# Altium footprint library MyPcbLib.PcbLib: 657 footprints (part 37 of 42)
Each footprint in its own frame and in the unit in brackets; x right, y up, seen from the top. Pads: shape width x height; smd on the part's side, far side on the other; paste and mask are expansions set on the pad; w line width, h text height; cw(c..) or ccw(c..) is an arc to the next point about the centre after c.
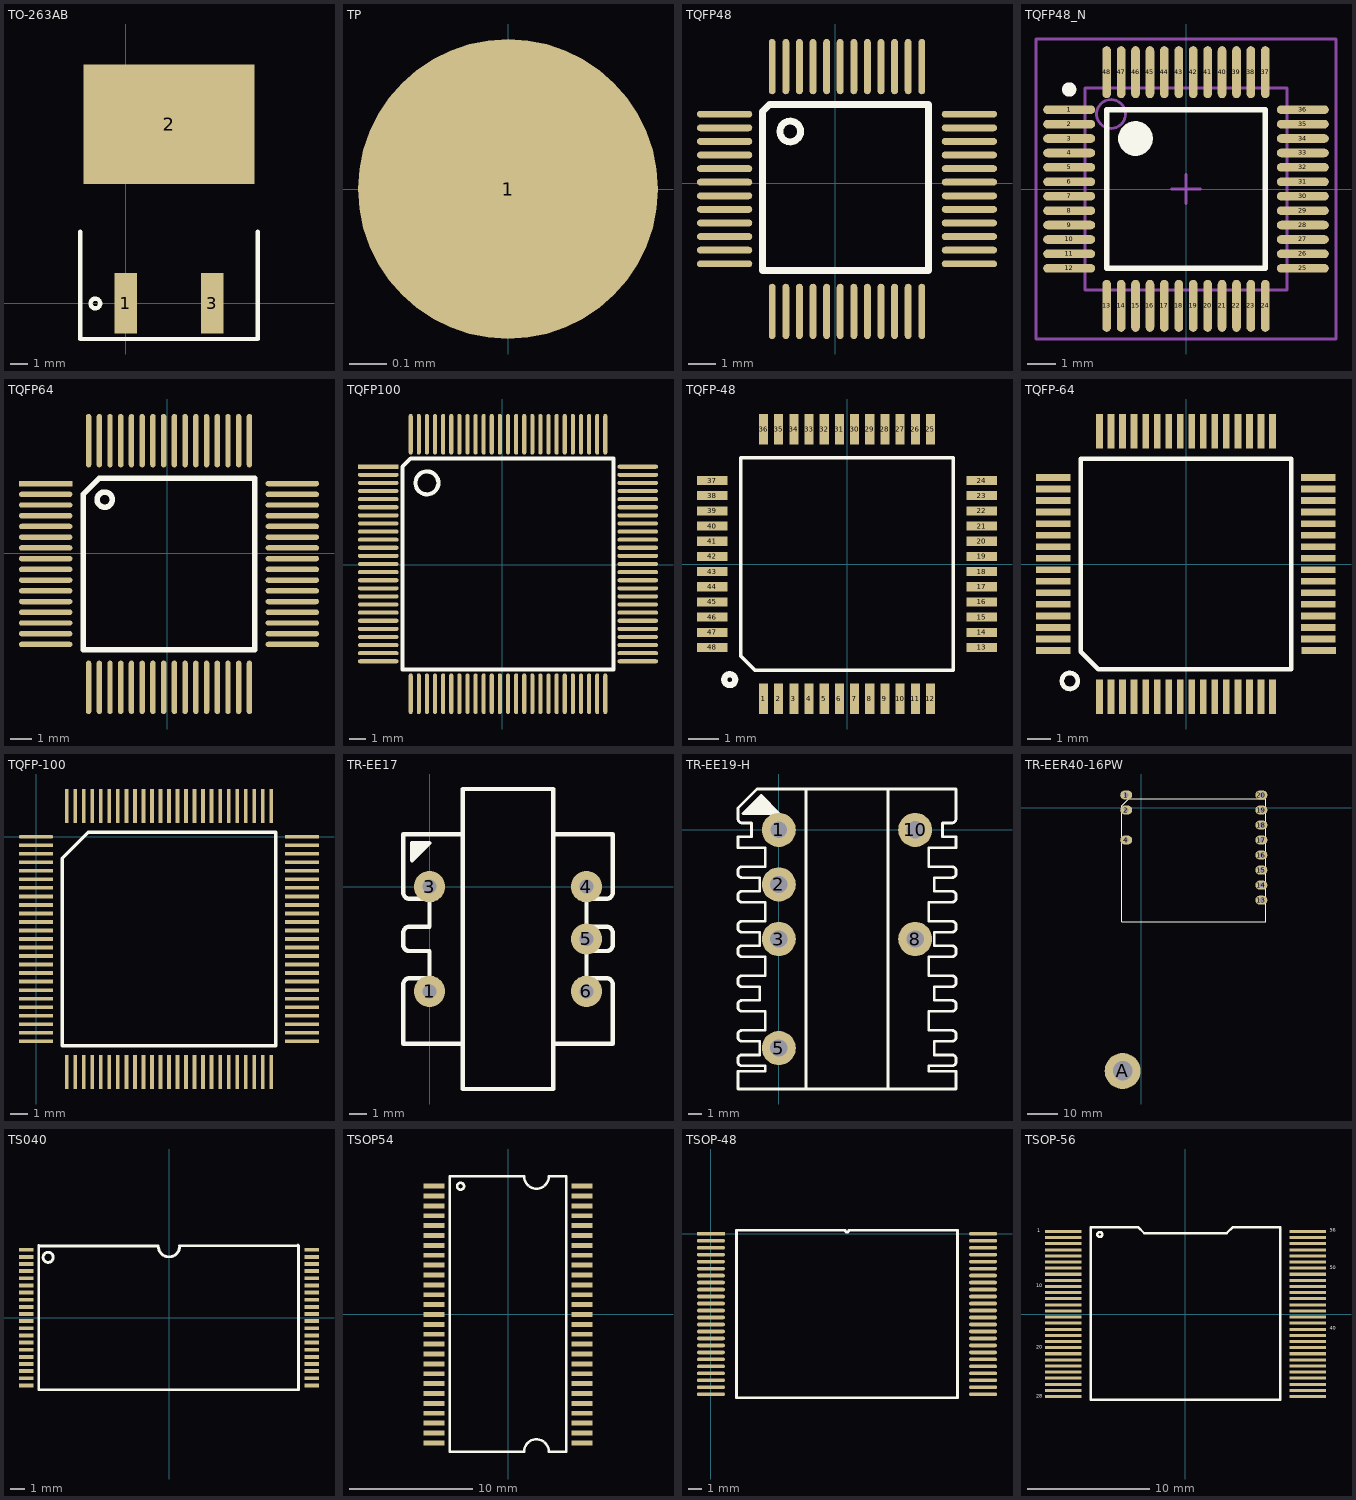
[diagram p36: the footprints below, top view; thin cyan lines are the x and y axes]

## TO-263AB [mm]
height 1.5
pads (3):
  rect 1.3x3.556 smd: 1(0,0) 3(5.08,0)
  rect 10x7 smd: 2(2.54,10.5)
Top Overlay:
  circle w0.254: c-1.778,-0.003 r0.284
  lines w0.254: -2.66,4.2 -2.66,-2.086 7.74,-2.086 7.74,4.2

## TP [mm]
pads (1):
  round 0.8 smd: 1(0,0)

## TQFP48 [mil]
pads (48):
  oval 80x10 smd: 1(-160,100) 2(-160,80.31) 3(-160,60.63) 4(-160,40.95) 5(-160,21.26) 6(-160,1.57) 7(-160,-18.11) 8(-160,-37.8) 9(-160,-57.48) 10(-160,-77.17) 11(-160,-96.85) 12(-160,-116.53) 25(194.33,-116.53) 26(194.33,-96.85) 27(194.33,-77.17) 28(194.33,-57.48) 29(194.33,-37.8) 30(194.33,-18.11) 31(194.33,1.57) 32(194.33,21.26) 33(194.33,40.95) 34(194.33,60.63) 35(194.33,80.31) 36(194.33,100)
  oval 10x80 smd: 13(-91.1,-185.43) 14(-71.42,-185.43) 15(-51.73,-185.43) 16(-32.05,-185.43) 17(-12.36,-185.43) 18(7.32,-185.43) 19(27.01,-185.43) 20(46.69,-185.43) 21(66.38,-185.43) 22(86.06,-185.43) 23(105.75,-185.43) 24(125.43,-185.43) 37(125.43,168.9) 38(105.75,168.9) 39(86.06,168.9) 40(66.38,168.9) 41(46.69,168.9) 42(27.01,168.9) 43(7.32,168.9) 44(-12.36,168.9) 45(-32.05,168.9) 46(-51.73,168.9) 47(-71.42,168.9) 48(-91.1,168.9)
Top Overlay:
  circle w10: c-65,75 r15
  lines w10: -105.02,103.8 -104.88,-126.38 135.28,-126.38 135.28,113.78 -95.04,113.78 -105.02,103.8

## TQFP48_N [mm] "Thin QFP, 48-Leads, Body 7x7mm, Pitch 0.5mm, IPC Medium Density"
height 1.6
pads (48):
  oval 1.8x0.3 smd: 1(-4.05,2.75) 2(-4.05,2.25) 3(-4.05,1.75) 4(-4.05,1.25) 5(-4.05,0.75) 6(-4.05,0.25) 7(-4.05,-0.25) 8(-4.05,-0.75) 9(-4.05,-1.25) 10(-4.05,-1.75) 11(-4.05,-2.25) 12(-4.05,-2.75) 25(4.05,-2.75) 26(4.05,-2.25) 27(4.05,-1.75) 28(4.05,-1.25) 29(4.05,-0.75) 30(4.05,-0.25) 31(4.05,0.25) 32(4.05,0.75) 33(4.05,1.25) 34(4.05,1.75) 35(4.05,2.25) 36(4.05,2.75)
  oval 0.3x1.8 smd: 13(-2.75,-4.05) 14(-2.25,-4.05) 15(-1.75,-4.05) 16(-1.25,-4.05) 17(-0.75,-4.05) 18(-0.25,-4.05) 19(0.25,-4.05) 20(0.75,-4.05) 21(1.25,-4.05) 22(1.75,-4.05) 23(2.25,-4.05) 24(2.75,-4.05) 37(2.75,4.05) 38(2.25,4.05) 39(1.75,4.05) 40(1.25,4.05) 41(0.75,4.05) 42(0.25,4.05) 43(-0.25,4.05) 44(-0.75,4.05) 45(-1.25,4.05) 46(-1.75,4.05) 47(-2.25,4.05) 48(-2.75,4.05)
Top Overlay:
  circle w0.6: c-1.75,1.75 r0.3
  circle w0.25: c-4.05,3.45 r0.125
  lines w0.2: -2.75,-2.75 2.75,-2.75 2.75,2.75 -2.75,2.75 -2.75,-2.75
Mechanical 13:
  circle w0.1: c-2.6,2.6 r0.5
  lines w0.1: -3.5,-3.5 3.5,-3.5 3.5,3.5 -3.5,3.5 -3.5,-3.5
Mechanical 15:
  lines w0.1: -0.5,0 0.5,0 ; 0,-0.5 0,0.5 ; -5.2,-5.2 5.2,-5.2 5.2,5.2 -5.2,5.2 -5.2,-5.2
3D body: height 1.6, standoff 0, extent -3.5,-3.5 3.5,3.5

## TQFP64 [mil]
pads (64):
  rect 98x10 smd: 1(-223.53,128.16)
  oval 98x10 smd: 2(-223.53,108.47) 3(-223.53,88.79) 4(-223.53,69.1) 5(-223.53,49.42) 6(-223.53,29.73) 7(-223.53,10.05) 8(-223.53,-9.64) 9(-223.53,-29.32) 10(-223.53,-49.01) 11(-223.53,-68.69) 12(-223.53,-88.38) 13(-223.53,-108.06) 14(-223.53,-127.75) 15(-223.53,-147.43) 16(-223.53,-167.12) 33(229.23,-167.12) 34(229.23,-147.43) 35(229.23,-127.75) 36(229.23,-108.06) 37(229.23,-88.38) 38(229.23,-68.69) 39(229.23,-49.01) 40(229.23,-29.32) 41(229.23,-9.64) 42(229.23,10.05) 43(229.23,29.73) 44(229.23,49.42) 45(229.23,69.1) 46(229.23,88.79) 47(229.23,108.47) 48(229.23,128.16)
  oval 10x98 smd: 17(-144.79,-245.86) 18(-125.1,-245.86) 19(-105.42,-245.86) 20(-85.73,-245.86) 21(-66.05,-245.86) 22(-46.36,-245.86) 23(-26.68,-245.86) 24(-6.99,-245.86) 25(12.69,-245.86) 26(32.38,-245.86) 27(52.06,-245.86) 28(71.75,-245.86) 29(91.43,-245.86) 30(111.12,-245.86) 31(130.8,-245.86) 32(150.49,-245.86) 49(150.49,206.9) 50(130.8,206.9) 51(111.12,206.9) 52(91.43,206.9) 53(71.75,206.9) 54(52.06,206.9) 55(32.38,206.9) 56(12.69,206.9) 57(-6.99,206.9) 58(-26.68,206.9) 59(-46.36,206.9) 60(-66.05,206.9) 61(-85.73,206.9) 62(-105.42,206.9) 63(-125.1,206.9) 64(-144.79,206.9)
Top Overlay:
  circle w10: c-115.26,98.63 r13.92
  lines w10: -154.63,-176.96 -154.63,108.47 -125.1,138 160.33,138 160.33,-176.96 -154.63,-176.96

## TQFP100 [mm]
pads (100):
  rect 2.5x0.254 smd: 1(-7.655,6.036)
  oval 2.5x0.254 smd: 2(-7.655,5.536) 3(-7.655,5.036) 4(-7.655,4.536) 5(-7.655,4.036) 6(-7.655,3.536) 7(-7.655,3.036) 8(-7.655,2.536) 9(-7.655,2.036) 10(-7.655,1.536) 11(-7.655,1.036) 12(-7.655,0.536) 13(-7.655,0.036) 14(-7.655,-0.464) 15(-7.655,-0.964) 16(-7.655,-1.464) 17(-7.655,-1.964) 18(-7.655,-2.464) 19(-7.655,-2.964) 20(-7.655,-3.464) 21(-7.655,-3.964) 22(-7.655,-4.464) 23(-7.655,-4.964) 24(-7.655,-5.464) 25(-7.655,-5.964) 51(8.345,-5.964) 52(8.345,-5.464) 53(8.345,-4.964) 54(8.345,-4.464) 55(8.345,-3.964) 56(8.345,-3.464) 57(8.345,-2.964) 58(8.345,-2.464) 59(8.345,-1.964) 60(8.345,-1.464) 61(8.345,-0.964) 62(8.345,-0.464) 63(8.345,0.036) 64(8.345,0.536) 65(8.345,1.036) 66(8.345,1.536) 67(8.345,2.036) 68(8.345,2.536) 69(8.345,3.036) 70(8.345,3.536) 71(8.345,4.036) 72(8.345,4.536) 73(8.345,5.036) 74(8.345,5.536) 75(8.345,6.036)
  oval 0.254x2.5 smd: 26(-5.655,-7.964) 27(-5.155,-7.964) 28(-4.655,-7.964) 29(-4.155,-7.964) 30(-3.655,-7.964) 31(-3.155,-7.964) 32(-2.655,-7.964) 33(-2.155,-7.964) 34(-1.655,-7.964) 35(-1.155,-7.964) 36(-0.655,-7.964) 37(-0.155,-7.964) 38(0.345,-7.964) 39(0.845,-7.964) 40(1.345,-7.964) 41(1.845,-7.964) 42(2.345,-7.964) 43(2.845,-7.964) 44(3.345,-7.964) 45(3.845,-7.964) 46(4.345,-7.964) 47(4.845,-7.964) 48(5.345,-7.964) 49(5.845,-7.964) 50(6.345,-7.964) 76(6.345,8.036) 77(5.845,8.036) 78(5.345,8.036) 79(4.845,8.036) 80(4.345,8.036) 81(3.845,8.036) 82(3.345,8.036) 83(2.845,8.036) 84(2.345,8.036) 85(1.845,8.036) 86(1.345,8.036) 87(0.845,8.036) 88(0.345,8.036) 89(-0.155,8.036) 90(-0.655,8.036) 91(-1.155,8.036) 92(-1.655,8.036) 93(-2.155,8.036) 94(-2.655,8.036) 95(-3.155,8.036) 96(-3.655,8.036) 97(-4.155,8.036) 98(-4.655,8.036) 99(-5.155,8.036) 100(-5.655,8.036)
Top Overlay:
  circle w0.254: c-4.655,5.036 r0.707
  lines w0.254: -6.155,-6.464 6.845,-6.464 6.845,6.536 -5.655,6.536 -6.155,6.036 -6.155,-6.464

## TQFP-48 [mm]
pads (48):
  rect 0.3x1 smd: 1(-2.75,-4.441) 2(-2.25,-4.441) 3(-1.75,-4.441) 4(-1.25,-4.441) 5(-0.75,-4.441) 6(-0.25,-4.441) 7(0.25,-4.441) 8(0.75,-4.441) 9(1.25,-4.441) 10(1.75,-4.441) 11(2.25,-4.441) 12(2.75,-4.441) 25(2.75,4.441) 26(2.25,4.441) 27(1.75,4.441) 28(1.25,4.441) 29(0.75,4.441) 30(0.25,4.441) 31(-0.25,4.441) 32(-0.75,4.441) 33(-1.25,4.441) 34(-1.75,4.441) 35(-2.25,4.441) 36(-2.75,4.441)
  rect 1x0.3 smd: 13(4.441,-2.75) 14(4.441,-2.25) 15(4.441,-1.75) 16(4.441,-1.25) 17(4.441,-0.75) 18(4.441,-0.25) 19(4.441,0.25) 20(4.441,0.75) 21(4.441,1.25) 22(4.441,1.75) 23(4.441,2.25) 24(4.441,2.75) 37(-4.441,2.75) 38(-4.441,2.25) 39(-4.441,1.75) 40(-4.441,1.25) 41(-4.441,0.75) 42(-4.441,0.25) 43(-4.441,-0.25) 44(-4.441,-0.75) 45(-4.441,-1.25) 46(-4.441,-1.75) 47(-4.441,-2.25) 48(-4.441,-2.75)
Top Overlay:
  circle w0.203: c-3.863,-3.81 r0.18
  lines w0.127: -3.5,-3.028 -3.5,3.5 3.5,3.5 3.5,-3.5 -3.028,-3.5 -3.5,-3.028

## TQFP-64 [mm]
pads (64):
  rect 0.3x1.5 smd: 1(-3.75,-5.766) 2(-3.25,-5.766) 3(-2.75,-5.766) 4(-2.25,-5.766) 5(-1.75,-5.766) 6(-1.25,-5.766) 7(-0.75,-5.766) 8(-0.25,-5.766) 9(0.25,-5.766) 10(0.75,-5.766) 11(1.25,-5.766) 12(1.75,-5.766) 13(2.25,-5.766) 14(2.75,-5.766) 15(3.25,-5.766) 16(3.75,-5.766) 33(3.75,5.766) 34(3.25,5.766) 35(2.75,5.766) 36(2.25,5.766) 37(1.75,5.766) 38(1.25,5.766) 39(0.75,5.766) 40(0.25,5.766) 41(-0.25,5.766) 42(-0.75,5.766) 43(-1.25,5.766) 44(-1.75,5.766) 45(-2.25,5.766) 46(-2.75,5.766) 47(-3.25,5.766) 48(-3.75,5.766)
  rect 1.5x0.3 smd: 17(5.766,-3.75) 18(5.75,-3.25) 19(5.75,-2.75) 20(5.75,-2.25) 21(5.75,-1.75) 22(5.75,-1.25) 23(5.75,-0.75) 24(5.75,-0.25) 25(5.75,0.25) 26(5.75,0.75) 27(5.75,1.25) 28(5.75,1.75) 29(5.75,2.25) 30(5.75,2.75) 31(5.75,3.25) 32(5.75,3.75) 49(-5.766,3.75) 50(-5.766,3.25) 51(-5.766,2.75) 52(-5.766,2.25) 53(-5.766,1.75) 54(-5.766,1.25) 55(-5.766,0.75) 56(-5.766,0.25) 57(-5.766,-0.25) 58(-5.766,-0.75) 59(-5.766,-1.25) 60(-5.766,-1.75) 61(-5.766,-2.25) 62(-5.766,-2.75) 63(-5.766,-3.25) 64(-5.766,-3.75)
Top Overlay:
  circle w0.203: c-5.046,-5.08 r0.347
  lines w0.203: -4.572,-3.81 -3.81,-4.572 4.572,-4.572 4.572,4.572 -4.572,4.572 -4.572,-3.81

## TQFP-100 [mm]
pads (100):
  oval 2x0.22 smd: 1(0,0)
  rect 2x0.22 smd: 2(0,-0.5) 3(0,-1) 4(0,-1.5) 5(0,-2) 6(0,-2.5) 7(0,-3) 8(0,-3.5) 9(0,-4) 10(0,-4.5) 11(0,-5) 12(0,-5.5) 13(0,-6) 14(0,-6.5) 15(0,-7) 16(0,-7.5) 17(0,-8) 18(0,-8.5) 19(0,-9) 20(0,-9.5) 21(0,-10) 22(0,-10.5) 23(0,-11) 24(0,-11.5) 25(0,-12) 51(15.6,-12) 52(15.6,-11.5) 53(15.6,-11) 54(15.6,-10.5) 55(15.6,-10) 56(15.6,-9.5) 57(15.6,-9) 58(15.6,-8.5) 59(15.6,-8) 60(15.6,-7.5) 61(15.6,-7) 62(15.6,-6.5) 63(15.6,-6) 64(15.6,-5.5) 65(15.6,-5) 66(15.6,-4.5) 67(15.6,-4) 68(15.6,-3.5) 69(15.6,-3) 70(15.6,-2.5) 71(15.6,-2) 72(15.6,-1.5) 73(15.6,-1) 74(15.6,-0.5) 75(15.6,0)
  rect 0.22x2 smd: 26(1.8,-13.8) 27(2.3,-13.8) 28(2.8,-13.8) 29(3.3,-13.8) 30(3.8,-13.8) 31(4.3,-13.8) 32(4.8,-13.8) 33(5.3,-13.8) 34(5.8,-13.8) 35(6.3,-13.8) 36(6.8,-13.8) 37(7.3,-13.8) 38(7.8,-13.8) 39(8.3,-13.8) 40(8.8,-13.8) 41(9.3,-13.8) 42(9.8,-13.8) 43(10.3,-13.8) 44(10.8,-13.8) 45(11.3,-13.8) 46(11.8,-13.8) 47(12.3,-13.8) 48(12.8,-13.8) 49(13.3,-13.8) 50(13.8,-13.8) 76(13.8,1.8) 77(13.3,1.8) 78(12.8,1.8) 79(12.3,1.8) 80(11.8,1.8) 81(11.3,1.8) 82(10.8,1.8) 83(10.3,1.8) 84(9.8,1.8) 85(9.3,1.8) 86(8.8,1.8) 87(8.3,1.8) 88(7.8,1.8) 89(7.3,1.8) 90(6.8,1.8) 91(6.3,1.8) 92(5.8,1.8) 93(5.3,1.8) 94(4.8,1.8) 95(4.3,1.8) 96(3.8,1.8) 97(3.3,1.8) 98(2.8,1.8) 99(2.3,1.8) 100(1.8,1.8)
Top Overlay:
  lines w0.2: 1.535,-12.265 1.535,-1.27 3.07,0.265 14.065,0.265 14.065,-12.265 1.535,-12.265

## TR-EE17 [mm]
pads (5):
  round 1.8 hole 0.8: 1(0,-6) 3(0,0) 4(9,0) 5(9,-3) 6(9,-6)
Top Overlay:
  region: -0.859,1.651 -0.222,2.288 -0.434,2.5 -1.071,1.864
  lines w0.25: -1.5,-0.407 -1.5,3 1.9,3 ; -1.5,-0.35 ccw(c-1.159,-0.35) -1.4,-0.591 ccw(c-1.159,-0.35) -1.159,-0.691 0,-0.7 0,-2.3 -1.159,-2.291 ccw(c-1.159,-2.633) -1.4,-2.391 ccw(c-1.159,-2.633) -1.5,-2.633 -1.5,-3.35 ccw(c-1.159,-3.35) -1.4,-3.591 ccw(c-1.159,-3.35) -1.159,-3.691 0,-3.7 0,-5.26 -1.159,-5.251 ccw(c-1.159,-5.593) -1.4,-5.351 ccw(c-1.159,-5.593) -1.5,-5.593 -1.5,-9 1.9,-9 ; 10.5,-0.407 10.5,3 7.1,3 ; 10.5,-0.35 cw(c10.159,-0.35) 10.4,-0.591 cw(c10.159,-0.35) 10.159,-0.691 9,-0.7 9,-2.3 10.159,-2.291 cw(c10.159,-2.633) 10.4,-2.391 cw(c10.159,-2.633) 10.5,-2.633 10.5,-3.35 cw(c10.159,-3.35) 10.4,-3.591 cw(c10.159,-3.35) 10.159,-3.691 9,-3.683 9,-5.243 10.159,-5.251 cw(c10.159,-5.593) 10.4,-5.351 cw(c10.159,-5.593) 10.5,-5.593 10.5,-9 7.1,-9 ; 1.9,-9 1.9,3 ; 1.9,-9 1.9,-11.6 7.1,-11.6 7.1,-9 ; 1.9,3 1.9,5.6 7.1,5.6 7.1,3 ; 7.1,-9 7.1,3 ; -1,1.51 -0.01,2.5 -1,2.5 -1,1.51
  lines w0.5: -0.788,2.146 -0.576,2.359

## TR-EE19-H [mm]
pads (6):
  round 2.5 hole 1.2: 1(0,0)
  round 2.5 hole 1.27: 2(0,-4) 3(0,-8) 5(0,-16) 8(10,-8) 10(10,0)
Top Overlay:
  rectangle: -1.666,1.5 -0.9,2.134
  rectangle: -0.7,1.2 -0.2,1.5
  rectangle: -1.945,1.2 -0.5,1.855
  lines w0.2: -2.659,0.5 cw(c-2.659,0.841) -2.9,0.6 cw(c-2.659,0.841) -3,0.841 -3,1.6 -1.6,3 13,3 13,0.841 cw(c12.659,0.841) 12.9,0.6 cw(c12.659,0.841) 12.659,0.5 ; -2.6,0.5 -2,0.5 -2,0 -2,-0.5 -3,-0.5 -3,-1.3 -1,-1.3 -1,-2.7 -2.7,-2.7 ccw(c-2.7,-3) -3,-3 -3,-3.2 ccw(c-2.7,-3.2) -2.7,-3.5 -1.4,-3.5 -1.4,-4.5 -2.7,-4.5 ccw(c-2.7,-4.8) -3,-4.8 -3,-5 ccw(c-2.7,-5) -2.7,-5.3 -1,-5.3 -1,-6.7 -2.7,-6.7 ccw(c-2.7,-7) -3,-7 -3,-7.2 ccw(c-2.7,-7.2) -2.7,-7.5 -1.4,-7.5 -1.4,-8.5 -2.7,-8.5 ccw(c-2.7,-8.8) -3,-8.8 -3,-9 ccw(c-2.7,-9) -2.7,-9.3 -1,-9.3 -1,-10.7 -2.7,-10.7 ccw(c-2.7,-11) -3,-11 -3,-11.2 ccw(c-2.7,-11.2) -2.7,-11.5 -1.4,-11.5 -1.4,-12.5 -2.7,-12.5 ccw(c-2.7,-12.8) -3,-12.8 -3,-13 ccw(c-2.7,-13) -2.7,-13.3 -1,-13.3 -1,-14.7 -2.7,-14.7 ccw(c-2.7,-15) -3,-15 -3,-15.2 ccw(c-2.7,-15.2) -2.7,-15.5 -1.4,-15.5 -1.4,-16.5 -2.7,-16.5 ccw(c-2.7,-16.8) -3,-16.8 -3,-17 ccw(c-2.7,-17) -2.7,-17.3 -1,-17.3 -1,-17.7 -3,-17.7 -3,-19 13,-19 13,-17.7 11,-17.7 11,-17.3 12.7,-17.3 ccw(c12.7,-17) 13,-17 13,-16.8 ccw(c12.7,-16.8) 12.7,-16.5 11.4,-16.5 11.4,-15.5 12.7,-15.5 ccw(c12.7,-15.2) 13,-15.2 13,-15 ccw(c12.7,-15) 12.7,-14.7 11,-14.7 11,-13.3 12.7,-13.3 ccw(c12.7,-13) 13,-13 13,-12.8 ccw(c12.7,-12.8) 12.7,-12.5 11.4,-12.5 11.4,-11.5 12.7,-11.5 ccw(c12.7,-11.2) 13,-11.2 13,-11 ccw(c12.7,-11) 12.7,-10.7 11,-10.7 11,-9.3 12.7,-9.3 ccw(c12.7,-9) 13,-9 13,-8.8 ccw(c12.7,-8.8) 12.7,-8.5 11.4,-8.5 11.4,-7.5 12.7,-7.5 ccw(c12.7,-7.2) 13,-7.2 13,-7 ccw(c12.7,-7) 12.7,-6.7 11,-6.7 11,-5.3 12.7,-5.3 ccw(c12.7,-5) 13,-5 13,-4.8 ccw(c12.7,-4.8) 12.7,-4.5 11.4,-4.5 11.4,-3.5 12.7,-3.5 ccw(c12.7,-3.2) 13,-3.2 13,-3 ccw(c12.7,-3) 12.7,-2.7 11,-2.7 11,-1.3 13,-1.3 13,-0.5 12,-0.5 12,0 12,0.5 12.6,0.5 ; 2,-19 2,3 ; 8,-19 8,3
  lines w0.25: -2.2,1.4 -1.6,1.4 ; -2.1,1.4 -1.2,2.3 ; -1.1,2.2 -0.3,1.4 ; -2.6,1.2 0,1.2 -1.3,2.5 -2.6,1.2

## TR-EER40-16PW [mm]
pads (12):
  oval 4x3 hole 1.6: 1(-5,4.2) 2(-5,-0.8) 4(-5,-10.8) 13(40,-30.8) 14(40,-25.8) 15(40,-20.8) 16(40,-15.8) 17(40,-10.8) 18(40,-5.8) 19(40,-0.8) 20(40,4.2)
  round 12 hole 6.5: A(-6.2,-87.7)
Top Overlay:
  lines w0.2: -6.5,0.5 -6.5,-38 41.5,-38 41.5,3 -4,3 -4.1,3 -6.5,0.6

## TS040 [mm]
pads (40):
  rect 1x0.27 smd: 1(-10,4.75) 2(-10,4.25) 3(-10,3.75) 4(-10,3.25) 5(-10,2.75) 6(-10,2.25) 7(-10,1.75) 8(-10,1.25) 9(-10,0.75) 10(-10,0.25) 11(-10,-0.25) 12(-10,-0.75) 13(-10,-1.25) 14(-10,-1.75) 15(-10,-2.25) 16(-10,-2.75) 17(-10,-3.25) 18(-10,-3.75) 19(-10,-4.25) 20(-10,-4.75) 21(10,-4.75) 22(10,-4.25) 23(10,-3.75) 24(10,-3.25) 25(10,-2.75) 26(10,-2.25) 27(10,-1.75) 28(10,-1.25) 29(10,-0.75) 30(10,-0.25) 31(10,0.25) 32(10,0.75) 33(10,1.25) 34(10,1.75) 35(10,2.25) 36(10,2.75) 37(10,3.25) 38(10,3.75) 39(10,4.25) 40(10,4.75)
Top Overlay:
  circle w0.203: c-8.459,4.221 r0.354
  lines w0.203: -9.12,5.05 -9.12,-5.05 9.067,-5.05 9.067,5.05 ; -9.093,5.004 -0.75,5.004 ccw(c0,5.004) 0.75,5.004 ; 0.737,5.029 8.992,5.029 9.042,5.08
3D body: height 1.2, standoff 0, extent -10.04,-5.05 10.16,5.05

## TSOP54 [mm]
pads (54):
  rect 1.72x0.4 smd: 1(-6,10.4) 2(-6,9.6) 3(-6,8.8) 4(-6,8) 5(-6,7.2) 6(-6,6.4) 7(-6,5.6) 8(-6,4.8) 9(-6,4) 10(-6,3.2) 11(-6,2.4) 12(-6,1.6) 13(-6,0.8) 14(-6,0) 15(-6,-0.8) 16(-6,-1.6) 17(-6,-2.4) 18(-6,-3.2) 19(-6,-4) 20(-6,-4.8) 21(-6,-5.6) 22(-6,-6.4) 23(-6,-7.2) 24(-6,-8) 25(-6,-8.8) 26(-6,-9.6) 27(-6,-10.4) 28(6,-10.4) 29(6,-9.6) 30(6,-8.8) 31(6,-8) 32(6,-7.2) 33(6,-6.4) 34(6,-5.6) 35(6,-4.8) 36(6,-4) 37(6,-3.2) 38(6,-2.4) 39(6,-1.6) 40(6,-0.8) 41(6,0) 42(6,0.8) 43(6,1.6) 44(6,2.4) 45(6,3.2) 46(6,4) 47(6,4.8) 48(6,5.6) 49(6,6.4) 50(6,7.2) 51(6,8) 52(6,8.8) 53(6,9.6) 54(6,10.4)
Top Overlay:
  circle w0.203: c-3.837,10.389 r0.281
  lines w0.203: -4.699,-11.11 -4.699,11.19 1.307,11.19 ccw(c2.307,11.19) 3.307,11.19 4.699,11.19 4.699,-11.11 3.301,-11.11 ccw(c2.301,-11.11) 1.301,-11.11 -4.699,-11.11

## TSOP-48 [mm]
pads (48):
  rect 2x0.27 smd: 1(0,0)
  oval 2x0.27 smd: 2(0,-0.5) 3(0,-1) 4(0,-1.5) 5(0,-2) 6(0,-2.5) 7(0,-3) 8(0,-3.5) 9(0,-4) 10(0,-4.5) 11(0,-5) 12(0,-5.5) 13(0,-6) 14(0,-6.5) 15(0,-7) 16(0,-7.5) 17(0,-8) 18(0,-8.5) 19(0,-9) 20(0,-9.5) 21(0,-10) 22(0,-10.5) 23(0,-11) 24(0,-11.5) 25(19.5,-11.5) 26(19.5,-11) 27(19.5,-10.5) 28(19.5,-10) 29(19.5,-9.5) 30(19.5,-9) 31(19.5,-8.5) 32(19.5,-8) 33(19.5,-7.5) 34(19.5,-7) 35(19.5,-6.5) 36(19.5,-6) 37(19.5,-5.5) 38(19.5,-5) 39(19.5,-4.5) 40(19.5,-4) 41(19.5,-3.5) 42(19.5,-3) 43(19.5,-2.5) 44(19.5,-2) 45(19.5,-1.5) 46(19.5,-1) 47(19.5,-0.5) 48(19.5,0)
Top Overlay:
  lines w0.2: 1.835,-11.75 17.665,-11.75 17.665,0.25 9.875,0.25 cw(c9.75,0.25) 9.625,0.25 1.835,0.25 1.835,-11.75

## TSOP-56 [mm]
pads (56):
  rect 3x0.25 smd: 1(-10,6.75) 2(-10,6.25) 3(-10,5.75) 4(-10,5.25) 5(-10,4.75) 6(-10,4.25) 7(-10,3.75) 8(-10,3.25) 9(-10,2.75) 10(-10,2.25) 11(-10,1.75) 12(-10,1.25) 13(-10,0.75) 14(-10,0.25) 15(-10,-0.25) 16(-10,-0.75) 17(-10,-1.25) 18(-10,-1.75) 19(-10,-2.25) 20(-10,-2.75) 21(-10,-3.25) 22(-10,-3.75) 23(-10,-4.25) 24(-10,-4.75) 25(-10,-5.25) 26(-10,-5.75) 27(-10,-6.25) 28(-10,-6.75) 29(10,-6.75) 30(10,-6.25) 31(10,-5.75) 32(10,-5.25) 33(10,-4.75) 34(10,-4.25) 35(10,-3.75) 36(10,-3.25) 37(10,-2.75) 38(10,-2.25) 39(10,-1.75) 40(10,-1.25) 41(10,-0.75) 42(10,-0.25) 43(10,0.25) 44(10,0.75) 45(10,1.25) 46(10,1.75) 47(10,2.25) 48(10,2.75) 49(10,3.25) 50(10,3.75) 51(10,4.25) 52(10,4.75) 53(10,5.25) 54(10,5.75) 55(10,6.25) 56(10,6.75)
Top Overlay:
  circle w0.203: c-7,6.5 r0.2
  lines w0.203: -7.75,-6.991 -7.75,7.109 -3.875,7.109 -3.37,6.604 3.37,6.604 3.875,7.109 7.75,7.109 7.75,-6.991 -7.75,-6.991
  text "56" at 11.811,6.604 h0.5
  text "50" at 11.811,3.531 h0.5
  text "40" at 11.811,-1.422 h0.5
  text "28" at -12.192,-6.985 h0.5
  text "20" at -12.217,-2.972 h0.5
  text "10" at -12.192,2.057 h0.5
  text "1" at -12.116,6.579 h0.5